# Altium footprint library MyPcbLib.PcbLib: 657 footprints (part 9 of 42)
Each footprint in its own frame and in the unit in brackets; x right, y up, seen from the top. Pads: shape width x height; smd on the part's side, far side on the other; paste and mask are expansions set on the pad; w line width, h text height; cw(c..) or ccw(c..) is an arc to the next point about the centre after c.
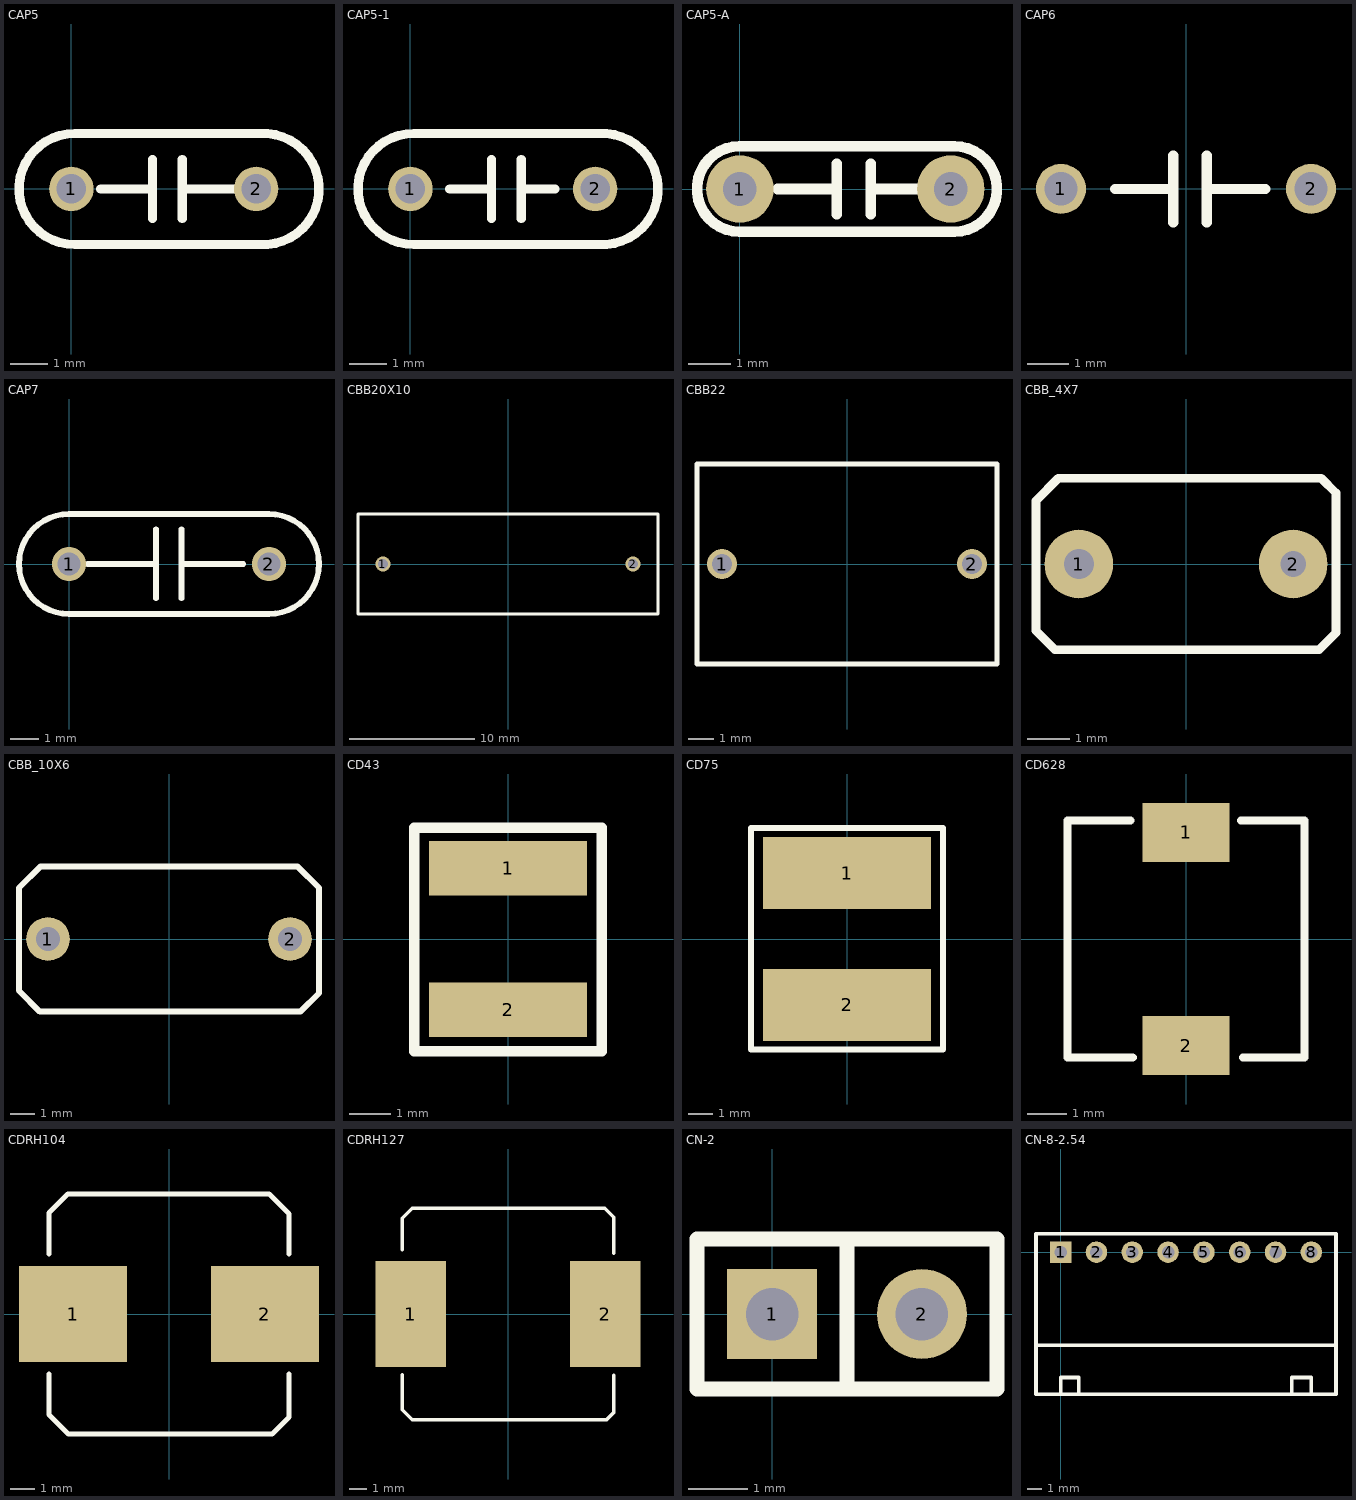
[diagram p8: the footprints below, top view; thin cyan lines are the x and y axes]

## CAP5 [mm]
pads (2):
  round 1.2 / inner round 1.2 / far side round 1.8 hole 0.8: 1(0,0) 2(5,0)
Top Overlay:
  lines w0.25: 0.797,-0.003 2.197,-0.003 ; 2.197,-0.803 2.197,0.797 ; 2.997,-0.803 2.997,0.797 ; 2.997,-0.003 4.397,-0.003 ; 0.097,-1.503 cw(c0.084,-0.003) 0.097,1.497 5.097,1.497 cw(c5.194,-0.003) 5.097,-1.503 0.097,-1.503

## CAP5-1 [mm]
pads (2):
  round 1.2 hole 0.8: 1(0,0) 2(5,0)
Top Overlay:
  lines w0.25: 1.067,-0.003 2.197,-0.003 ; 2.197,-0.803 2.197,0.797 ; 2.997,-0.803 2.997,0.797 ; 2.997,-0.003 3.912,-0.003 ; 0.097,-1.503 cw(c0.084,-0.003) 0.097,1.497 5.097,1.497 cw(c5.194,-0.003) 5.097,-1.503 0.097,-1.503

## CAP5-A [mm]
pads (2):
  round 1.6 hole 0.8: 1(0,0) 2(5,0)
Top Overlay:
  lines w0.25: 0.9,0 2.3,0 ; 2.3,-0.6 2.3,0.6 ; 3.1,-0.6 3.1,0.6 ; 3.1,0 4.5,0
  lines w0.254: 0,-1.016 cw(c0,0) 0,1.016 5.08,1.016 cw(c5.08,0) 5.08,-1.016 0,-1.016

## CAP6 [mm]
pads (2):
  round 1.2 / inner round 1.2 / far side round 1.8 hole 0.8: 1(-3,0) 2(3,0)
Top Overlay:
  lines w0.25: -1.703,-0.003 -0.303,-0.003 ; -0.303,-0.803 -0.303,0.797 ; 0.497,-0.803 0.497,0.797 ; 0.497,-0.003 1.897,-0.003

## CAP7 [mm]
pads (2):
  round 1.2 / inner round 1.2 / far side oval 1.8x2 hole 0.8: 1(0,0) 2(7,0)
Top Overlay:
  lines w0.2: 0.66,0 3.048,0 ; 3.048,-1.194 3.048,1.219 ; 3.937,-1.194 3.937,1.219 ; 4.064,0 6.096,0 ; 6.95,1.75 0,1.75 ccw(c0,0) 0,-1.75 7,-1.75 ccw(c7,0) 7,1.75

## CBB20X10 [mm]
pads (2):
  round 1.2 hole 0.8: 1(-10,0) 2(10,0)
Top Overlay:
  lines w0.203: -12,-4 -12,4 12,4 12,-4 -12,-4

## CBB22 [mm]
pads (2):
  round 1.2 hole 0.8: 1(-5,0) 2(5,0)
Top Overlay:
  lines w0.203: -6,-4 -6,4 6,4 6,-4 -6,-4

## CBB_4X7 [mm]
pads (2):
  round 1.6 hole 0.7: 1(-2.5,0)
  round 1.6 hole 0.6: 2(2.5,0)
Top Overlay:
  lines w0.203: -3.5,-1.555 -3.5,1.478 -2.978,2 3.156,2 3.5,1.656 3.5,-1.605 3.105,-2 -3.055,-2 -3.5,-1.555

## CBB_10X6 [mm]
pads (2):
  round 1.8 hole 1: 1(-5,0) 2(5,0)
Top Overlay:
  lines w0.254: -6.198,-2.134 -6.198,2.108 -5.306,3 5.306,3 6.198,2.108 6.198,-2.235 5.433,-3 -5.331,-3 -6.198,-2.134

## CD43 [mm]
pads (2):
  rect 3.8x1.3 smd: 1(0,1.7) 2(0,-1.7)
Top Overlay:
  lines w0.254: -2.25,-2.692 2.25,-2.692 2.25,2.667 -2.25,2.667 -2.25,-2.692

## CD75 [mm]
pads (2):
  rect 7x3 smd: 1(0,2.75) 2(0,-2.75)
Top Overlay:
  lines w0.254: -4,-4.597 -4,4.623 4,4.623 4,-4.597 -4,-4.597

## CD628 [mm] "SLF6028"
pads (2):
  rect 2.2x1.5 smd: 1(0,2.7) 2(0,-2.7)
Top Overlay:
  lines w0.203: -1.4,3 -3,3 -3,-3 -1.349,-3 ; 1.397,3 3,3 3,-3 1.448,-3

## CDRH104 [mm]
pads (2):
  rect 4.5x4 smd: 1(-4,0) 2(4,0)
Top Overlay:
  lines w0.203: -5,-2.5 -5,-4.195 -4.195,-5 4.296,-5 5,-4.296 5,-2.5 ; -5,2.5 -5,4.22 -4.22,5 4.169,5 5,4.169 5,2.5

## CDRH127 [mm]
pads (2):
  rect 4x6 smd: 1(-5.5,0) 2(5.5,0)
Top Overlay:
  lines w0.203: -6,-3.454 -6,-5.43 -5.43,-6 5.582,-6 6,-5.582 6,-3.48 ; -6,3.632 -6,5.43 -5.43,6 5.481,6 6,5.481 6,3.454
3D body: height 7.5, standoff 0.05, extent -6.171,-5.848 6.171,6.152

## CN-2 [mil]
pads (2):
  rect 60x60 hole 35: 1(0,0)
  round 60 hole 35: 2(100,0)
Top Overlay:
  lines w10: 50,-50 50,50 ; -50,-50 150,-50 150,50 -50,50 -50,-50

## CN-8-2.54 [mil]
pads (8):
  rect 60x60 hole 35: 1(0,0)
  round 60 hole 35: 2(100,0) 3(200,0) 4(300,0) 5(400,0) 6(500,0) 7(600,0) 8(700,0)
Top Overlay:
  lines w10: -68.9,50 -68.9,-259.84 ; -68.9,51.18 768.9,51.18 768.9,-259.84 ; 0,-396.69 0,-350 50,-350 50,-396.69 ; 645,-391.69 645,-350 700,-350 700,-396.69 ; 768.9,-396.69 -68.9,-396.69 -68.9,-259.84 ; 768.9,-395 768.9,-259.84 ; -68.9,-259.84 768.9,-259.84